# Altium footprint library kalios.PcbLib: 404 footprints (part 25 of 26)
Each footprint in its own frame and in the unit in brackets; x right, y up, seen from the top. Pads: shape width x height; smd on the part's side, far side on the other; paste and mask are expansions set on the pad; w line width, h text height; cw(c..) or ccw(c..) is an arc to the next point about the centre after c.
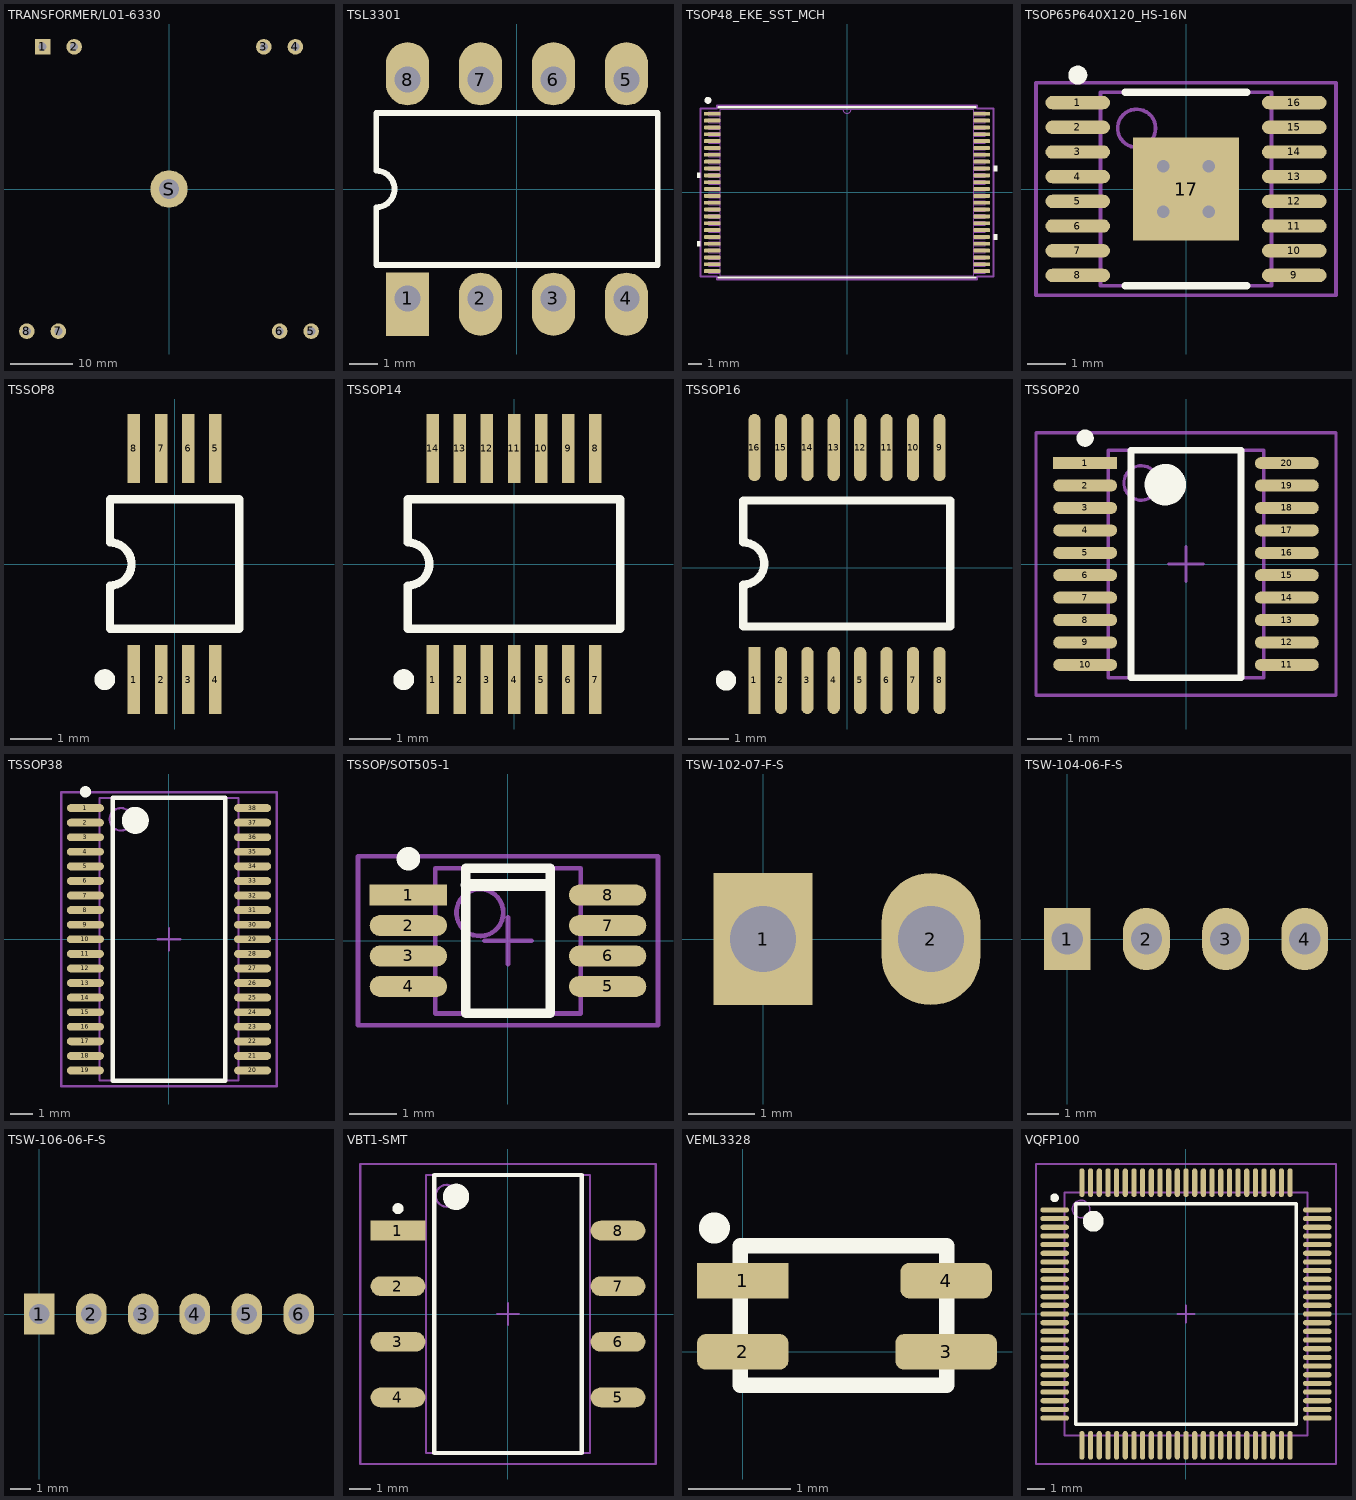
[diagram p24: the footprints below, top view; thin cyan lines are the x and y axes]

## TRANSFORMER/L01-6330 [mm]
pads (9):
  rect 2.5x2.5 hole 1.3: 1(-20.32,22.86)
  round 2.5 hole 1.3: 2(-15.24,22.86) 3(15.24,22.86) 4(20.32,22.86) 5(22.86,-22.86) 6(17.78,-22.86) 7(-17.78,-22.86) 8(-22.86,-22.86)
  round 6 hole 3.2: S(0,0)
Top Designator:
  text ".Designator" at -7.609,-0.533 h1.52
3D body "L01-6330.STEP": height 24, standoff -6, extent -24.841,-24.875 24.859,24.825

## TSL3301 [mm] "8-Pin Plastic Dual In-Line Package (PDIP)"
height 4.32
pads (8):
  rect 1.5x2.2 hole 0.9 copper offset 0,-0.2: 1(-3.81,-3.81)
  oval 1.5x2.2 hole 0.9 copper offset 0,-0.2: 2(-1.27,-3.81) 3(1.27,-3.81) 4(3.81,-3.81)
  oval 1.5x2.2 hole 0.9 copper offset 0,0.2: 5(3.81,3.81) 6(1.27,3.81) 7(-1.27,3.81) 8(-3.81,3.81)
Top Overlay:
  lines w0.2: -4.9,-2.65 4.9,-2.65 4.9,2.65 -4.9,2.65 -4.9,0.635 cw(c-4.9,0) -4.9,-0.635 -4.9,-2.65
Top Designator:
  text ".Designator" at -7.655,-0.508 h1.52
3D body "3301.STEP": height 4.07, standoff -1.16, extent -5.537,-3.525 5.463,3.525

## TSOP48_EKE_SST_MCH [mil]
pads (48):
  rect 47.5x11 smd paste+0 mask+0: 1(-387.75,226.38)
  rrect50% 47.5x11 smd paste+0 mask+0: 2(-387.75,206.69) 3(-387.75,187.01) 4(-387.75,167.32) 5(-387.75,147.64) 6(-387.75,127.95) 7(-387.75,108.27) 8(-387.75,88.58) 9(-387.75,68.9) 10(-387.75,49.21) 11(-387.75,29.53) 12(-387.75,9.84) 13(-387.75,-9.84) 14(-387.75,-29.53) 15(-387.75,-49.21) 16(-387.75,-68.9) 17(-387.75,-88.58) 18(-387.75,-108.27) 19(-387.75,-127.95) 20(-387.75,-147.64) 21(-387.75,-167.32) 22(-387.75,-187.01) 23(-387.75,-206.69) 24(-387.75,-226.38) 25(387.75,-226.38) 26(387.75,-206.69) 27(387.75,-187.01) 28(387.75,-167.32) 29(387.75,-147.64) 30(387.75,-127.95) 31(387.75,-108.27) 32(387.75,-88.58) 33(387.75,-68.9) 34(387.75,-49.21) 35(387.75,-29.53) 36(387.75,-9.84) 37(387.75,9.84) 38(387.75,29.53) 39(387.75,49.21) 40(387.75,68.9) 41(387.75,88.58) 42(387.75,108.27) 43(387.75,127.95) 44(387.75,147.64) 45(387.75,167.32) 46(387.75,187.01) 47(387.75,206.69) 48(387.75,226.38)
Top Overlay:
  circle w10: c-400,265 r5
  region: -421.5,56.71 -431.5,56.71 -431.5,41.71 -421.5,41.71
  region: -421.5,-140.14 -431.5,-140.14 -431.5,-155.14 -421.5,-155.14
  region: 421.5,-120.45 431.5,-120.45 431.5,-135.45 421.5,-135.45
  region: 421.5,76.4 431.5,76.4 431.5,61.4 421.5,61.4
  lines w6: -369,-245 369,-245 ; -369,245 369,245
Top 3D Body:
  drawing of 197 lines, arcs and shapes, not listed
Top Courtyard:
  lines w6: -421.5,-241.88 -421.5,241.88 -374,241.88 -374,250 374,250 374,241.88 421.5,241.88 421.5,-241.88 374,-241.88 374,-250 -374,-250 -374,-241.88 -421.5,-241.88
3D body "TSOP48_EKE_SST_MCH.step": height 47.09, standoff 0, extent -397.52,-240 397.52,240

## TSOP65P640X120_HS-16N [mm] "TSOP, 16-Leads, Body 5.1x4.5mm (max), Pitch 0.65mm, IPC Medium Density"
height 1.2
pads (17):
  oval 1.7x0.35 smd: 1(-2.85,2.275) 2(-2.85,1.625) 3(-2.85,0.975) 4(-2.85,0.325) 5(-2.85,-0.325) 6(-2.85,-0.975) 7(-2.85,-1.625) 8(-2.85,-2.275) 9(2.85,-2.275) 10(2.85,-1.625) 11(2.85,-0.975) 12(2.85,-0.325) 13(2.85,0.325) 14(2.85,0.975) 15(2.85,1.625) 16(2.85,2.275)
  rect 2.8x2.7 smd: 17(0,0)
via -0.6,0.6 diameter 0.66 hole 0.33
via 0.6,0.6 diameter 0.66 hole 0.33
via -0.6,-0.6 diameter 0.66 hole 0.33
via 0.6,-0.6 diameter 0.66 hole 0.33
Top Overlay:
  circle w0.25: c-2.85,3 r0.125
  lines w0.2: -1.6,-2.55 1.6,-2.55 ; -1.6,2.55 1.6,2.55
Top 3D Body:
  circle w0.1: c-1.3,1.6 r0.5
  lines w0.1: -2.25,-2.55 -2.25,2.55 2.25,2.55 2.25,-2.55 -2.25,-2.55
Top Courtyard:
  lines w0.1: -0.5,0 0.5,0 ; 0,-0.5 0,0.5 ; -3.95,-2.8 -3.95,2.8 3.95,2.8 3.95,-2.8 -3.95,-2.8
Top Designator:
  text ".Designator" at -7.618,-0.308 h1.52
3D body "User Library-IPC SO.STEP": height 1.35, standoff 0, extent -3.228,-2.55 3.228,2.55

## TSSOP8 [mm] "Shrink Small Outline; 8 Leads; Body Width 4.4 mm; Pitch 0.65 mm"
height 1.2
pads (8):
  rect 0.3x1.65 smd: 1(-0.975,-2.775) 2(-0.325,-2.775) 3(0.325,-2.775) 4(0.975,-2.775) 5(0.975,2.775) 6(0.325,2.775) 7(-0.325,2.775) 8(-0.975,2.775)
Top Overlay:
  circle w0.25: c-1.675,-2.775 r0.125
  lines w0.2: -1.55,-1.55 -1.55,-0.517 ccw(c-1.55,0) -1.55,0.517 -1.55,1.55 1.55,1.55 1.55,-1.55 -1.55,-1.55
Top Designator:
  text ".Designator" at -7.755,-0.508 h1.52

## TSSOP14 [mm] "Shrink Small Outline; 14 Leads; Body Width 4.4 mm; Pitch 0.65 mm"
height 1.2
pads (14):
  rect 0.3x1.65 smd: 1(-1.95,-2.775) 2(-1.3,-2.775) 3(-0.65,-2.775) 4(0,-2.775) 5(0.65,-2.775) 6(1.3,-2.775) 7(1.95,-2.775) 8(1.95,2.775) 9(1.3,2.775) 10(0.65,2.775) 11(0,2.775) 12(-0.65,2.775) 13(-1.3,2.775) 14(-1.95,2.775)
Top Overlay:
  circle w0.25: c-2.65,-2.775 r0.125
  lines w0.2: -2.55,-1.55 2.55,-1.55 2.55,1.55 -2.55,1.55 -2.55,0.517 cw(c-2.55,0) -2.55,-0.517 -2.55,-1.55
Top Designator:
  text ".Designator" at -7.743,-0.508 h1.52
3D body "TSSOP14.STEP": height 1.09, standoff -0.01, extent -2.56,-3.175 2.54,3.225

## TSSOP16 [mm] "Shrink Small Outline; 16 Leads; Body Width 4.4 mm; Pitch 0.65 mm"
height 1.2
pads (16):
  rect 0.3x1.65 smd: 1(-2.275,-2.775)
  oval 0.3x1.65 smd: 2(-1.625,-2.775) 3(-0.975,-2.775) 4(-0.325,-2.775) 5(0.325,-2.775) 6(0.975,-2.775) 7(1.625,-2.775) 8(2.275,-2.775) 9(2.275,2.953) 10(1.625,2.953) 11(0.975,2.953) 12(0.325,2.953) 13(-0.325,2.953) 14(-0.975,2.953) 15(-1.625,2.953) 16(-2.275,2.953)
Top Overlay:
  circle w0.25: c-2.975,-2.775 r0.125
  lines w0.2: -2.55,-1.448 2.54,-1.448 2.54,1.652 -2.55,1.652 -2.55,0.618 cw(c-2.55,0.102) -2.55,-0.415 -2.55,-1.448
Top Designator:
  text ".Designator" at -7.91,-0.419 h1.52
3D body "TSSOP-16 5.1x4.4.STEP": height 1.12, standoff 0.02, extent -2.565,-3.149 2.535,3.251

## TSSOP20 [mm] "TSOP, 20-Leads, Body 6.6x4.5mm (max), Pitch 0.65mm, IPC Low Density"
height 1.2
pads (20):
  rect 1.85x0.35 smd: 1(-2.925,2.925)
  oval 1.85x0.35 smd: 2(-2.925,2.275) 3(-2.925,1.625) 4(-2.925,0.975) 5(-2.925,0.325) 6(-2.925,-0.325) 7(-2.925,-0.975) 8(-2.925,-1.625) 9(-2.925,-2.275) 10(-2.925,-2.925) 11(2.925,-2.925) 12(2.925,-2.275) 13(2.925,-1.625) 14(2.925,-0.975) 15(2.925,-0.325) 16(2.925,0.325) 17(2.925,0.975) 18(2.925,1.625) 19(2.925,2.275) 20(2.925,2.925)
Top Overlay:
  circle w0.6: c-0.6,2.3 r0.3
  circle w0.25: c-2.925,3.65 r0.125
  lines w0.2: -1.6,-3.3 1.6,-3.3 1.6,3.3 -1.6,3.3 -1.6,-3.3
Top 3D Body:
  circle w0.1: c-1.3,2.35 r0.5
  lines w0.1: -2.25,-3.3 2.25,-3.3 2.25,3.3 -2.25,3.3 -2.25,-3.3
Top Courtyard:
  lines w0.1: -0.5,0 0.5,0 ; 0,-0.5 0,0.5 ; -4.35,-3.8 4.35,-3.8 4.35,3.8 -4.35,3.8 -4.35,-3.8
Top Designator:
  text ".Designator" at -7.618,-0.483 h1.52
3D body "TSSOP-20 6.6x4.4.STEP": height 1.1, standoff 0, extent -3.124,-3.298 3.276,3.302

## TSSOP38 [mm] "TSOP, 38-Leads, Body 12.6x6.2mm (max), Pitch 0.65mm, IPC Medium Density"
height 1.2
pads (38):
  oval 1.65x0.35 smd: 1(-3.725,5.85) 2(-3.725,5.2) 3(-3.725,4.55) 4(-3.725,3.9) 5(-3.725,3.25) 6(-3.725,2.6) 7(-3.725,1.95) 8(-3.725,1.3) 9(-3.725,0.65) 10(-3.725,0) 11(-3.725,-0.65) 12(-3.725,-1.3) 13(-3.725,-1.95) 14(-3.725,-2.6) 15(-3.725,-3.25) 16(-3.725,-3.9) 17(-3.725,-4.55) 18(-3.725,-5.2) 19(-3.725,-5.85) 20(3.725,-5.85) 21(3.725,-5.2) 22(3.725,-4.55) 23(3.725,-3.9) 24(3.725,-3.25) 25(3.725,-2.6) 26(3.725,-1.95) 27(3.725,-1.3) 28(3.725,-0.65) 29(3.725,0) 30(3.725,0.65) 31(3.725,1.3) 32(3.725,1.95) 33(3.725,2.6) 34(3.725,3.25) 35(3.725,3.9) 36(3.725,4.55) 37(3.725,5.2) 38(3.725,5.85)
Top Overlay:
  circle w0.6: c-1.5,5.3 r0.3
  circle w0.25: c-3.725,6.575 r0.125
  lines w0.2: -2.5,-6.3 2.5,-6.3 2.5,6.3 -2.5,6.3 -2.5,-6.3
Top 3D Body:
  circle w0.1: c-2.15,5.35 r0.5
  lines w0.1: -3.1,-6.3 3.1,-6.3 3.1,6.3 -3.1,6.3 -3.1,-6.3
Top Courtyard:
  lines w0.1: -0.5,0 0.5,0 ; 0,-0.5 0,0.5 ; -4.8,-6.55 4.8,-6.55 4.8,6.55 -4.8,6.55 -4.8,-6.55
Top Designator:
  text ".Designator" at -7.618,-0.395 h1.52
3D body "TSSOP-38 12.6x6.2.STEP": height 1.05, standoff -0.05, extent -4.05,-6.3 4.05,6.3

## TSSOP/SOT505-1 [mm] "TSSOP, 8-Leads, Body 3.1x3.1mm (max), Pitch 0.65mm, IPC Medium Density"
height 1.1
pads (8):
  rect 1.65x0.45 smd: 1(-2.125,0.975)
  oval 1.65x0.45 smd: 2(-2.125,0.325) 3(-2.125,-0.325) 4(-2.125,-0.975) 5(2.125,-0.975) 6(2.125,-0.325) 7(2.125,0.325) 8(2.125,0.975)
Top Overlay:
  circle w0.25: c-2.125,1.75 r0.125
  lines w0.2: -0.9,-1.55 -0.9,1.55 0.9,1.55 0.9,-1.55 -0.9,-1.55
  lines w0.254: -0.889,1.194 0.864,1.194
Top 3D Body:
  circle w0.1: c-0.6,0.6 r0.5
  lines w0.1: -1.55,-1.55 -1.55,1.55 1.55,1.55 1.55,-1.55 -1.55,-1.55
Top Courtyard:
  lines w0.1: -0.5,0 0.5,0 ; 0,-0.5 0,0.5 ; -3.2,-1.8 -3.2,1.8 3.2,1.8 3.2,-1.8 -3.2,-1.8
Top Designator:
  text ".Designator" at -7.618,-0.433 h1.52
3D body "SOT505-1.STEP": height 1.11, standoff 0.01, extent -2.379,-1.551 2.43,1.549

## TSW-102-07-F-S [mm]
pads (2):
  rect 1.5x2 hole 1 unplated: 1(0,0)
  oval 1.5x2 hole 1 unplated: 2(2.54,0)
Top Designator:
  text ".Designator" at -6.348,-0.457 h1.52
3D body "TSW-102-07-X-S.step": height 8.36, standoff -2.56, extent -1.27,-1.219 3.81,1.321

## TSW-104-06-F-S [mm]
pads (4):
  rect 1.5x2 hole 1 unplated: 1(0,0)
  oval 1.5x2 hole 1 unplated: 2(2.54,0) 3(5.08,0) 4(7.62,0)
Top Designator:
  text ".Designator" at -3.808,-0.457 h1.52
3D body "tsw-104-07-f-s.STEP": height 8.36, standoff -2.56, extent -1.27,-1.219 8.89,1.321

## TSW-106-06-F-S [mm]
pads (6):
  rect 1.5x2 hole 1 unplated: 1(0,0)
  oval 1.5x2 hole 1 unplated: 2(2.54,0) 3(5.08,0) 4(7.62,0) 5(10.16,0) 6(12.7,0)
Top Designator:
  text ".Designator" at -1.268,-0.457 h1.52
3D body "tsw-106-06-f-s.STEP": height 8.36, standoff -2.56, extent -1.27,-1.219 13.97,1.321

## VBT1-SMT [mm] "VBT1-SMT"
height 6
pads (8):
  rect 2.5x0.9 smd: 1(-5.025,3.81)
  oval 2.5x0.9 smd: 2(-5.025,1.27) 3(-5.025,-1.27) 4(-5.025,-3.81) 5(5.025,-3.81) 6(5.025,-1.27) 7(5.025,1.27) 8(5.025,3.81)
Top Overlay:
  circle w0.6: c-2.375,5.35 r0.3
  circle w0.25: c-5.025,4.81 r0.125
  lines w0.2: -3.375,-6.35 3.375,-6.35 3.375,6.35 -3.375,6.35 -3.375,-6.35
Top 3D Body:
  circle w0.1: c-2.8,5.4 r0.5
  lines w0.1: -3.75,-6.35 3.75,-6.35 3.75,6.35 -3.75,6.35 -3.75,-6.35
Top Courtyard:
  lines w0.1: -0.5,0 0.5,0 ; 0,-0.5 0,0.5 ; -6.75,-6.85 6.75,-6.85 6.75,6.85 -6.75,6.85 -6.75,-6.85
Top Designator:
  text ".Designator" at -7.618,-0.508 h1.52
3D body "CUI-DEFAULT.STEP": height 6.24, standoff -0.02, extent -5.601,-6.35 5.652,6.35

## VEML3328 [mm]
pads (4):
  rect 0.9x0.35 smd: 1(0,0.7)
  rrect50% 0.9x0.35 smd: 2(0,0) 4(2,0.7)
  rrect50% 1x0.35 smd: 3(2,0)
Top Overlay:
  circle w0.254: c-0.279,1.219 r0.025
  lines w0.152: -0.025,1.016 -0.025,-0.33 2.007,-0.33 2.007,1.041 -0.025,1.041

## VQFP100 [mm] "TSQFP, 100-Leads, Body 16.0x16.0mm (max), Pitch 0.50mm, IPC Medium Density"
height 1.2
pads (100):
  oval 1.65x0.3 smd: 1(-7.575,6) 2(-7.575,5.5) 3(-7.575,5) 4(-7.575,4.5) 5(-7.575,4) 6(-7.575,3.5) 7(-7.575,3) 8(-7.575,2.5) 9(-7.575,2) 10(-7.575,1.5) 11(-7.575,1) 12(-7.575,0.5) 13(-7.575,0) 14(-7.575,-0.5) 15(-7.575,-1) 16(-7.575,-1.5) 17(-7.575,-2) 18(-7.575,-2.5) 19(-7.575,-3) 20(-7.575,-3.5) 21(-7.575,-4) 22(-7.575,-4.5) 23(-7.575,-5) 24(-7.575,-5.5) 25(-7.575,-6) 51(7.575,-6) 52(7.575,-5.5) 53(7.575,-5) 54(7.575,-4.5) 55(7.575,-4) 56(7.575,-3.5) 57(7.575,-3) 58(7.575,-2.5) 59(7.575,-2) 60(7.575,-1.5) 61(7.575,-1) 62(7.575,-0.5) 63(7.575,0) 64(7.575,0.5) 65(7.575,1) 66(7.575,1.5) 67(7.575,2) 68(7.575,2.5) 69(7.575,3) 70(7.575,3.5) 71(7.575,4) 72(7.575,4.5) 73(7.575,5) 74(7.575,5.5) 75(7.575,6)
  oval 0.3x1.65 smd: 26(-6,-7.575) 27(-5.5,-7.575) 28(-5,-7.575) 29(-4.5,-7.575) 30(-4,-7.575) 31(-3.5,-7.575) 32(-3,-7.575) 33(-2.5,-7.575) 34(-2,-7.575) 35(-1.5,-7.575) 36(-1,-7.575) 37(-0.5,-7.575) 38(0,-7.575) 39(0.5,-7.575) 40(1,-7.575) 41(1.5,-7.575) 42(2,-7.575) 43(2.5,-7.575) 44(3,-7.575) 45(3.5,-7.575) 46(4,-7.575) 47(4.5,-7.575) 48(5,-7.575) 49(5.5,-7.575) 50(6,-7.575) 76(6,7.575) 77(5.5,7.575) 78(5,7.575) 79(4.5,7.575) 80(4,7.575) 81(3.5,7.575) 82(3,7.575) 83(2.5,7.575) 84(2,7.575) 85(1.5,7.575) 86(1,7.575) 87(0.5,7.575) 88(0,7.575) 89(-0.5,7.575) 90(-1,7.575) 91(-1.5,7.575) 92(-2,7.575) 93(-2.5,7.575) 94(-3,7.575) 95(-3.5,7.575) 96(-4,7.575) 97(-4.5,7.575) 98(-5,7.575) 99(-5.5,7.575) 100(-6,7.575)
Top Overlay:
  circle w0.25: c-7.575,6.7 r0.125
  circle w0.6: c-5.35,5.35 r0.3
  lines w0.2: -6.35,-6.35 -6.35,6.35 6.35,6.35 6.35,-6.35 -6.35,-6.35
Top 3D Body:
  circle w0.1: c-6.05,6.05 r0.5
  lines w0.1: -7,-7 -7,7 7,7 7,-7 -7,-7
Top Courtyard:
  lines w0.1: -0.5,0 0.5,0 ; 0,-0.5 0,0.5 ; -8.65,-8.65 -8.65,8.65 8.65,8.65 8.65,-8.65 -8.65,-8.65
Top Designator:
  text ".Designator" at -7.618,-0.508 h1.52
3D body "User Library-IPC QFP-full.STEP": height 1.35, standoff 0, extent -8.004,-8.028 8.052,8.028